# Altium footprint library Power_PCB.PcbLib: 52 footprints (part 1 of 4)
Each footprint in its own frame and in the unit in brackets; x right, y up, seen from the top. Pads: shape width x height; smd on the part's side, far side on the other; paste and mask are expansions set on the pad; w line width, h text height; cw(c..) or ccw(c..) is an arc to the next point about the centre after c.
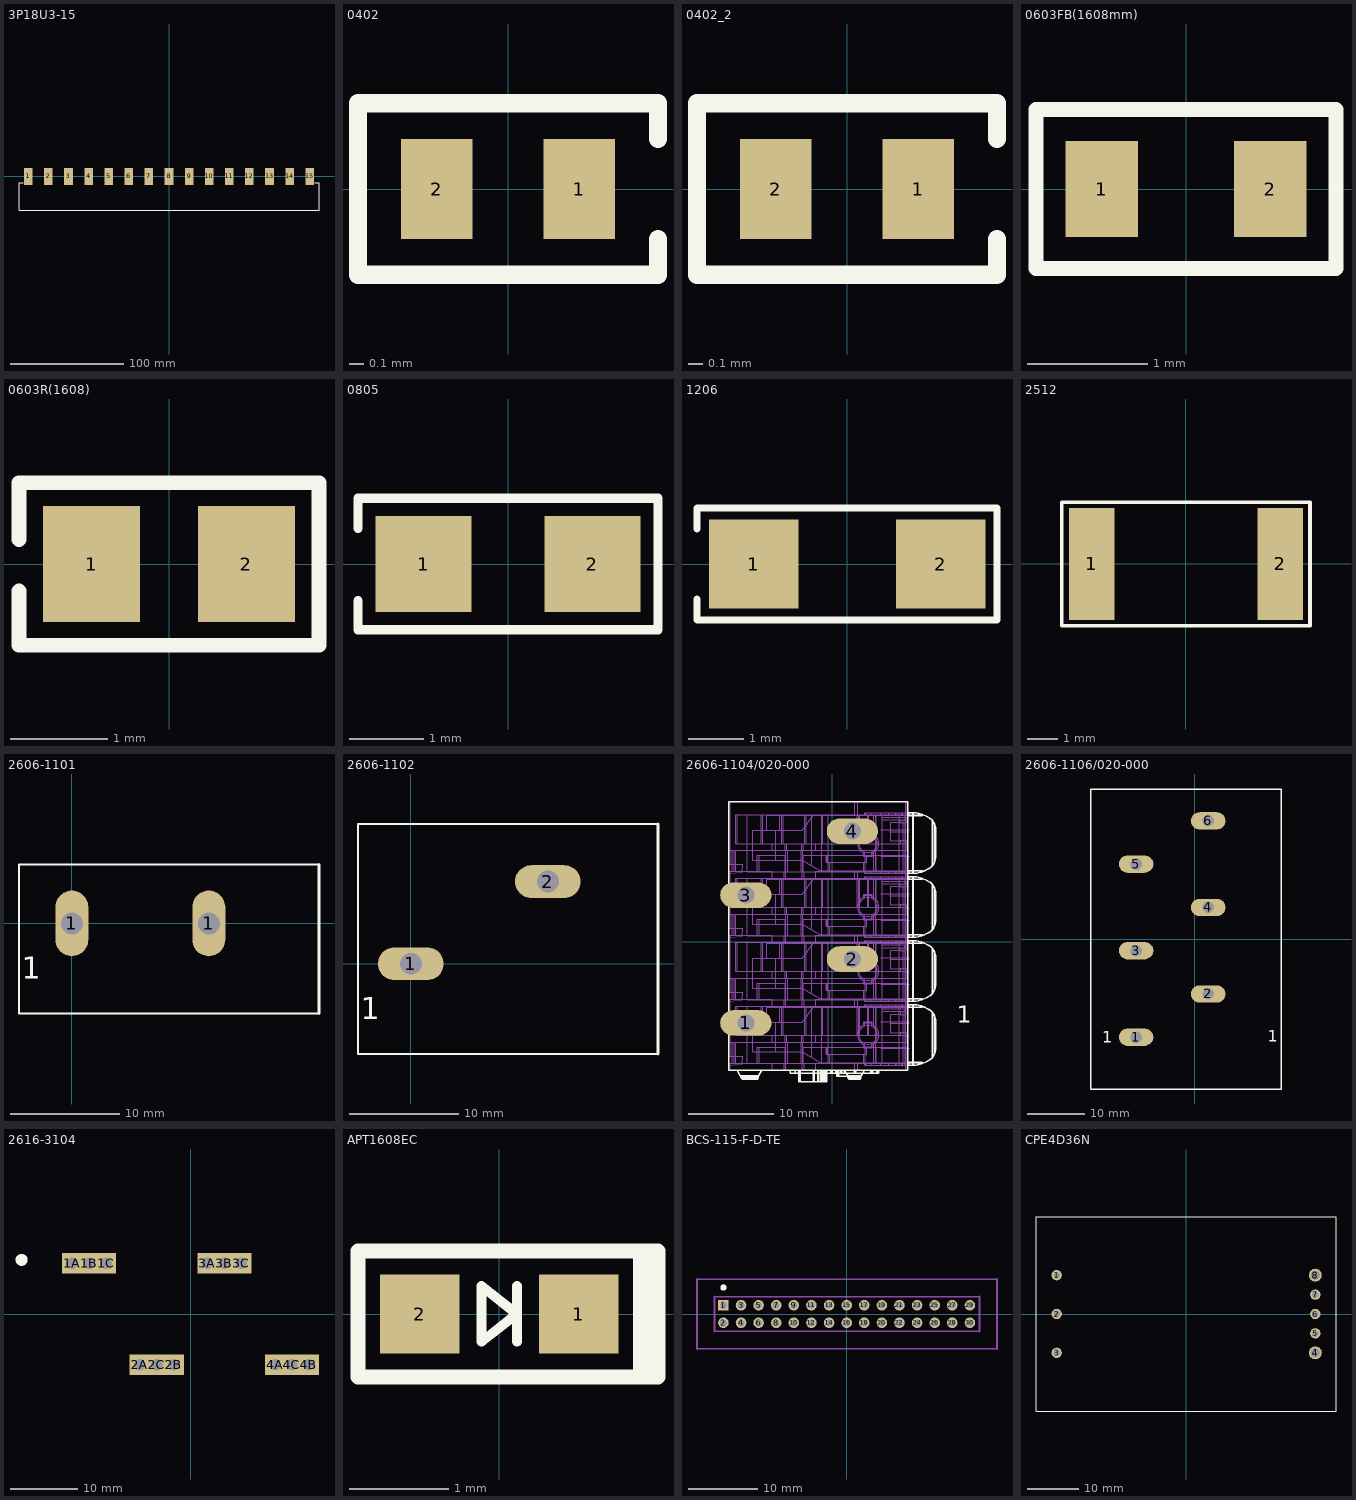
[diagram p0: the footprints below, top view; thin cyan lines are the x and y axes]

## 3P18U3-15 [mm] "BUSBAR3 PHASE+1/2P18SQMM PIN TYP"
pads (15):
  rect 7.62x15.24 smd: 1(-124.25,0) 2(-106.5,0) 3(-88.75,0) 4(-71,0) 5(-53.25,0) 6(-35.5,0) 7(-17.75,0) 8(0,0) 9(17.75,0) 10(35.5,0) 11(53.25,0) 12(71,0) 13(88.75,0) 14(106.5,0) 15(124.25,0)
Top Overlay:
  lines w0.127: -128.466,-5.706 -132.434,-5.706 -132.434,-29.706 132.434,-29.706 132.434,-5.706 128.466,-5.706
3D body: height 21.6, standoff 0, extent -132.441,-29.705 132.45,-5.702

## 0402 [mm]
height 0.762
pads (2):
  rect 0.5x0.7 smd: 1(0.5,0) 2(-0.5,0)
Top Overlay:
  lines w0.127: 0.83,-0.6 1.05,-0.6 ; 0.83,0.6 1.05,0.6 ; 1.05,-0.35 1.05,-0.6 ; 1.05,0.35 1.05,0.6 ; 1.05,-0.6 -1.05,-0.6 -1.05,0.6 1.05,0.6
3D body: height 0.2, standoff 0, extent 0.4,-0.3 0.6,0.3
3D body: height 0.2, standoff 0, extent -0.6,-0.3 -0.4,0.3
3D body: height 0.2, standoff 0, extent -0.4,-0.3 0.4,0.3

## 0402_2 [mm]
pads (2):
  rect 0.5x0.7 smd: 1(0.5,0) 2(-0.5,0)
Top Overlay:
  lines w0.127: 0.83,-0.6 1.05,-0.6 ; 0.83,0.6 1.05,0.6 ; 1.05,-0.35 1.05,-0.6 ; 1.05,0.35 1.05,0.6 ; 1.05,-0.6 -1.05,-0.6 -1.05,0.6 1.05,0.6
3D body: height 0.2, standoff 0, extent -0.4,-0.3 0.4,0.3
3D body: height 0.2, standoff 0, extent -0.6,-0.3 -0.4,0.3
3D body: height 0.2, standoff 0, extent 0.4,-0.3 0.6,0.3

## 0603FB(1608mm) [mm]
pads (2):
  rect 0.6x0.8 smd: 1(-0.7,0) 2(0.7,0)
Top Overlay:
  lines w0.127: -1.245,-0.66 1.245,-0.66 1.245,0.66 -1.245,0.66 -1.245,-0.66
3D body: height 0.9, standoff 0.1, extent 0.45,-0.4 0.8,0.4
3D body: height 0.9, standoff 0.1, extent -0.8,-0.4 -0.45,0.4
3D body: height 0.9, standoff 0.1, extent -0.45,-0.4 0.45,0.4

## 0603R(1608) [mm]
pads (2):
  rect 1x1.2 smd: 1(-0.8,0) 2(0.8,0)
Top Overlay:
  lines w0.152: -1.549,-0.279 -1.549,-0.838 1.549,-0.838 1.549,0.838 -1.549,0.838 -1.549,0.254
3D body: height 0.9, standoff 0.1, extent 0.45,-0.4 0.8,0.4
3D body: height 0.9, standoff 0.1, extent -0.8,-0.4 -0.45,0.4
3D body: height 0.9, standoff 0.1, extent -0.45,-0.4 0.45,0.4

## 0805 [mm]
pads (2):
  rect 1.3x1.3 smd: 1(-1.143,0) 2(1.143,0)
Top Overlay:
  lines w0.127: -2.032,-0.495 -2.032,-0.889 2.032,-0.889 2.032,0.889 -2.032,0.889 ; -2.032,0.483 -2.032,0.876
3D body "User Library-0805 SMD Capacitor.step": height 0.78, standoff 0, extent -1,-0.625 1,0.625

## 1206 [mil]
pads (2):
  rect 64x64 smd: 1(-67,0) 2(67,0)
Top Overlay:
  lines w5: -107.5,-40 -107.5,-25 ; -107.5,25 -107.5,40 ; -107.09,-40 107.09,-40 107.09,40 -107.09,40
3D body "User Library-1206 SMD Capacitor.step": height 39.45, standoff 0, extent -62.01,-31.5 63.98,31.5

## 2512 [mm]
height 0.508
pads (2):
  rect 1.5x3.7 smd: 1(-3.125,0) 2(3.125,0)
Top Overlay:
  lines w0.127: -4.12,-2.05 4.11,-2.05 4.11,2.05 -4.12,2.05 -4.12,-2.05
3D body "User Library-res2512_body.STEP": height 0.62, standoff 0, extent -3.2,-1.6 3.119,1.6

## 2606-1101 [mm] "PCB terminal block, lever 6 mm² Pin spacing 7.5 mm 1-pole, gray"
pads (2):
  oval 3x6 hole 2: 1(0,0) 1(12.5,0)
Top Overlay:
  lines w0.2: 22.555,-8.23 -4.826,-8.23 -4.826,5.385 22.555,5.385
  lines w0.254: 22.555,-8.23 22.555,5.385
  text "1" at -4.572,-5.055 h2
3D body "2606-1101.stp": height 24, standoff -4, extent -2,-6.85 22.3,3.5

## 2606-1102 [mm] "PCB terminal block, lever 6 mm² Pin spacing 7.5 mm 2-pole, gray"
pads (2):
  oval 6x3 hole 2: 1(0,0) 2(12.5,7.5)
Top Overlay:
  lines w0.2: 22.555,-8.23 -4.826,-8.23 -4.826,12.751 22.555,12.751
  lines w0.254: 22.555,-8.23 22.555,12.751
  text "1" at -4.572,-5.055 h2
3D body "2606-1102_020-000.stp": height 24, standoff -4, extent -2,-6.825 22.3,11.025

## 2606-1104/020-000 [mm] "PCB terminal block, lever 6 mm² Pin spacing 7.5 mm 4-pole, gray"
pads (4):
  oval 6x3 hole 2: 1(-10.15,-9.525) 2(2.35,-2.025) 3(-10.15,5.475) 4(2.35,12.975)
Top Overlay:
  drawing of 315 lines, arcs and shapes, not listed
  text "1" at 14.6,-9.525 h2
Mechanical 13:
  drawing of 850 lines, arcs and shapes, not listed
3D body "2606-1104_020-000.stp": height 24, standoff -4, extent -12.235,-16.298 12.065,16.552

## 2606-1106/020-000 [mm] "PCB terminal block, lever 6 mm² Pin spacing 7.5 mm 4-pole, gray"
pads (6):
  oval 6x3 hole 2: 1(-10.15,-17.025) 2(2.35,-9.525) 3(-10.15,-2.025) 4(2.35,5.475) 5(-10.15,12.975) 6(2.35,20.475)
Top Overlay:
  lines w0.254: -18,-26 -18,26 15,26 15,-26 -18,-26
  text "1" at 12.7,-17.78 h2
  text "1" at -16,-18 h2
3D body "2606-1106_020-000.stp": height 24, standoff -4, extent -12.15,-23.85 12.15,24

## 2616-3104 [mm]
pads (12):
  rect 3x3 hole 1.702 mask+0: 1A(-17.5,7.5) 1B(-15,7.5) 1C(-12.5,7.5) 2A(-7.5,-7.5) 2B(-2.5,-7.5) 2C(-5,-7.5) 3A(2.5,7.5) 3B(5,7.5) 3C(7.5,7.5) 4A(12.5,-7.5) 4B(17.5,-7.5) 4C(15,-7.5)
Top Overlay:
  circle w1.016: c-25,8 r0.381
3D body "2616-3104_020-000.stp": height 34.2, standoff -4, extent -23.3,-11.5 19.5,17.9

## APT1608EC [mm]
pads (2):
  rect 0.8x0.8 smd: 1(0.8,0) 2(-0.8,0)
Top Overlay:
  lines w0.1: 0.178,-0.279 0.178,0.282 ; -0.178,-0.279 -0.178,0.282 ; -0.178,-0.279 -0.178,0.282 ; -0.178,-0.279 0.178,0.001 -0.178,0.282
  lines w0.15: 1.511,-0.635 1.511,0.635 1.422,0.635 ; 1.422,-0.635 1.422,0.635 ; 1.422,-0.635 -1.422,-0.635 -1.422,0.635 1.422,0.635 ; 1.422,-0.635 1.6,-0.635 1.6,0.635 1.422,0.635 ; 1.422,-0.635 1.422,0.635
3D body "APT1608.STEP": height 0.72, standoff -0.03, extent -0.801,-0.4 0.81,0.4

## BCS-115-F-D-TE [mil]
pads (30):
  rect 60x60 hole 40: 1(-700,50)
  round 60 hole 40: 2(-700,-50) 3(-600,50) 4(-600,-50) 5(-500,50) 6(-500,-50) 7(-400,50) 8(-400,-50) 9(-300,50) 10(-300,-50) 11(-200,50) 12(-200,-50) 13(-100,50) 14(-100,-50) 15(0,50) 16(0,-50) 17(100,50) 18(100,-50) 19(200,50) 20(200,-50) 21(300,50) 22(300,-50) 23(400,50) 24(400,-50) 25(500,50) 26(500,-50) 27(600,50) 28(600,-50) 29(700,50) 30(700,-50)
Top Overlay:
  circle w20: c-700,150 r7.87
Mechanical 4:
  circle w15.75: c-699,152 r7.87
Mechanical 15:
  lines w10: -850,-200 -850,200 ; -850,-197.5 850,-197.5 ; -850,197.5 850,197.5 ; -750,-100 -750,100 ; -750,-97.5 750,-97.5 ; -750,97.5 750,97.5 ; 753.94,-100 753.94,100 ; 853.94,-200 853.94,200
3D body "BCS-115-F-D-TE.stp": height 290, standoff -122, extent -750,-100 750,100

## CPE4D36N [mil] "24V 4A 18-72VIN 8TH NEG ENB"
pads (8):
  round 80 hole 52: 1(-1000,300) 2(-1000,0) 3(-1000,-300) 5(1000,-150) 6(1000,0) 7(1000,150)
  round 100 hole 72: 4(1000,-300) 8(1000,300)
Top Overlay:
  lines w5: -1160,-752 1160,-752 1160,752 -1160,752 -1160,-752
3D body: height 118.11, standoff 0, extent 755,-247.5 821,-191
3D body: height 118.11, standoff 0, extent 650.5,-398.24 755,-332
3D body: height 118.11, standoff 0, extent -851,-368.5 -785,-312
3D body: height 118.11, standoff 0, extent -673.5,-153 -617,-87
3D body: height 118.11, standoff 0, extent -708,-368 -531,-282
3D body: height 118.11, standoff 0, extent -851,131 -576,307
3D body: height 118.11, standoff 0, extent 258,-360 492,-233
3D body: height 236.22, standoff 0, extent -1160,-202 -806,0
3D body: height 314.96, standoff 0, extent -404,-400 24,417
3D body: height 500, standoff 0, extent 279,-121 806,351
3D body: height 62.99, standoff 0, extent -1159.45,-460.63 1159.45,460.63